# Altium footprint library XU-GENARAL PCB .PcbLib: 1176 footprints (part 16 of 75)
Each footprint in its own frame and in the unit in brackets; x right, y up, seen from the top. Pads: shape width x height; smd on the part's side, far side on the other; paste and mask are expansions set on the pad; w line width, h text height; cw(c..) or ccw(c..) is an arc to the next point about the centre after c.
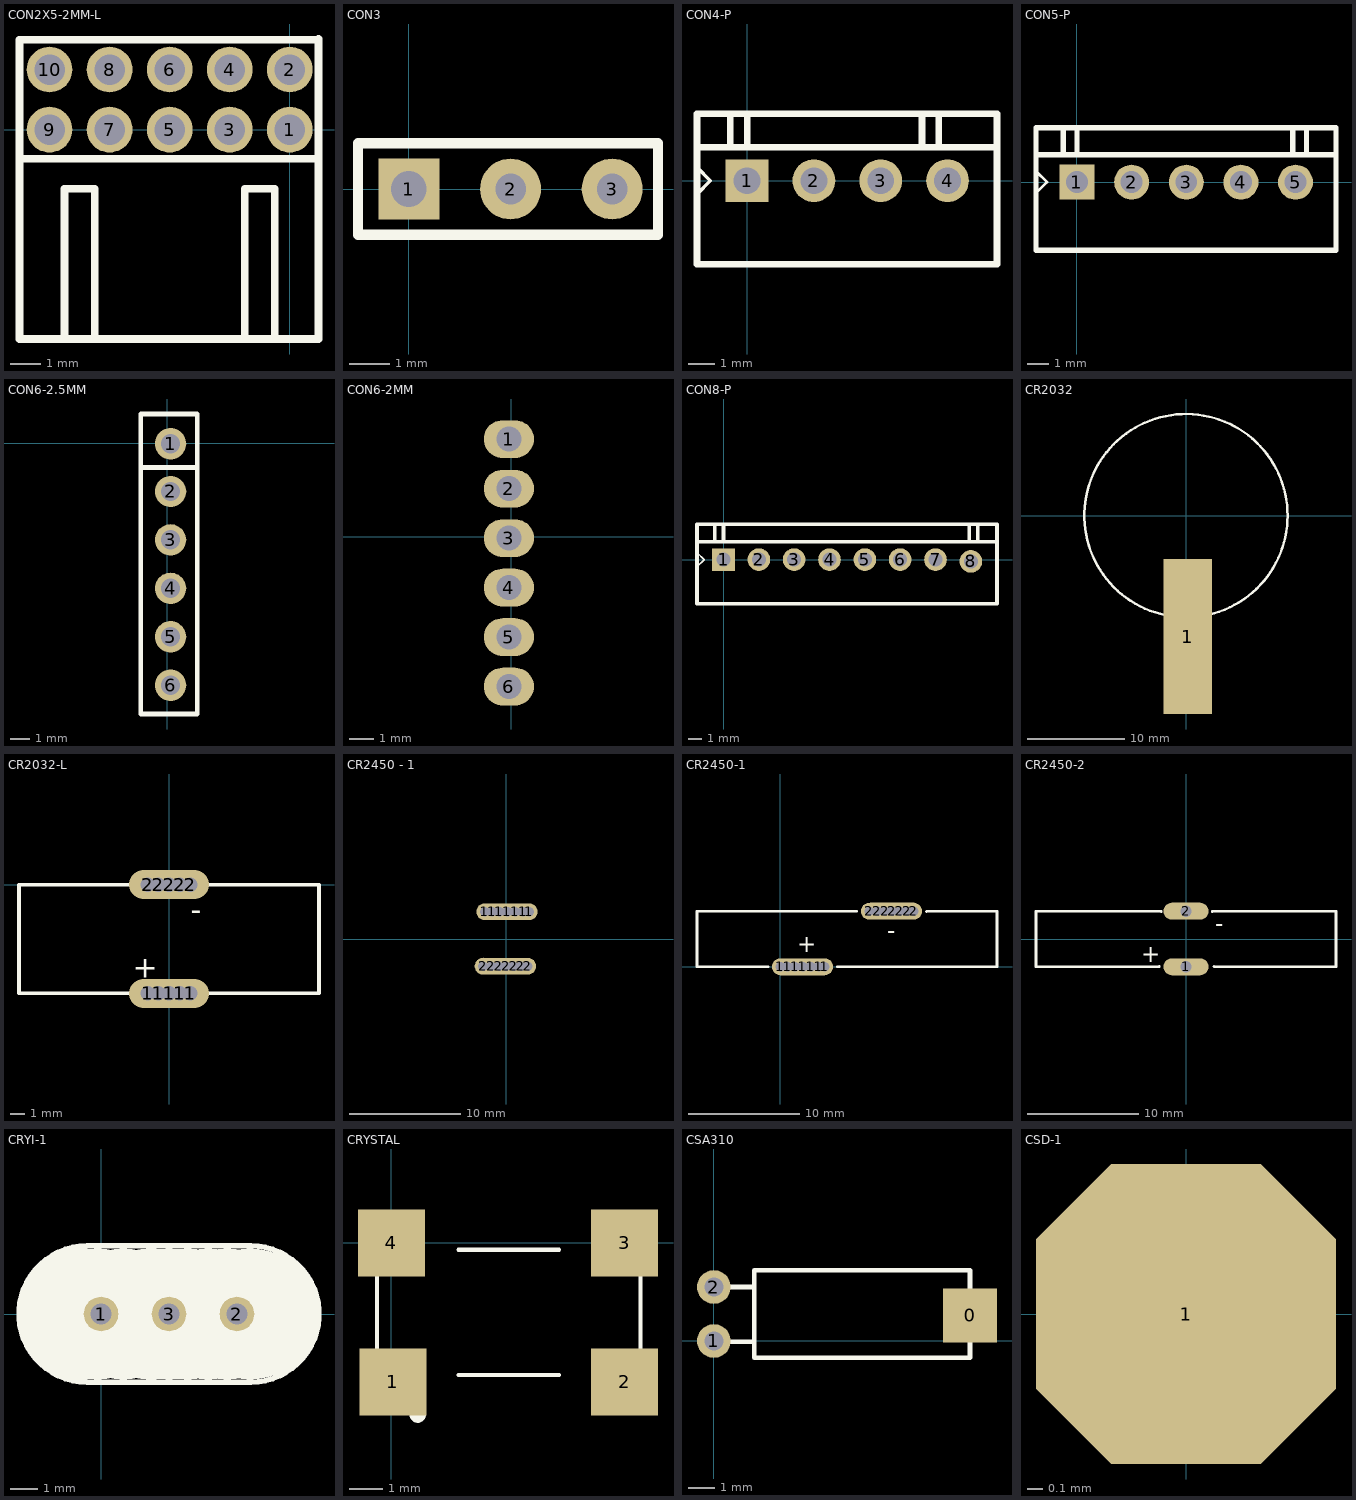
[diagram p15: the footprints below, top view; thin cyan lines are the x and y axes]

## CON2X5-2MM-L [mil]
pads (10):
  round 60 hole 40: 1(0,0) 2(0,78.74) 3(-78.74,0) 4(-78.74,78.74) 5(-157.48,0) 6(-157.48,78.74) 7(-236.22,0) 8(-236.22,78.74) 9(-314.96,0) 10(-314.96,78.74)
Top Overlay:
  lines w10: -295.28,-274.48 -295.28,-77.63 -275.59,-77.63 -255.91,-77.63 -255.91,-274.48 ; -59.06,-274.48 -59.06,-77.63 -19.68,-77.63 -19.68,-274.48 ; 30.6,-38.26 -354.33,-38.26 ; 33.6,117.74 -354.33,117.74 -354.33,-38.26 ; 37.6,118.74 37.6,-38.26 37.6,-274.48 -354.33,-274.48 -354.33,-38.26

## CON3 [mil]
height 43.31
pads (3):
  rect 60x60 hole 35: 1(0,0)
  round 60 hole 30: 2(100,0) 3(200,0)
Top Overlay:
  lines w10: -50,-45 245,-45 245,45 -50,45 -50,-45

## CON4-P [mil]
pads (4):
  rect 64x64 hole 40: 1(0,0)
  round 64 hole 40: 2(100,0) 3(200,0) 4(300,0)
Top Overlay:
  lines w5: -75,-20 -55,0 -75,20
  lines w10: -75,50 374.02,50 ; -25,50 -25,100 ; 0,50 0,100 ; 261.89,50 261.89,100 ; 286.89,50 286.89,100 ; -75,-125 374.02,-125 374.02,100 -75,100 -75,-125

## CON5-P [mil]
pads (5):
  rect 64x64 hole 40: 1(0,0)
  round 64 hole 40: 2(100,0) 3(200,0) 4(300,0) 5(400,0)
Top Overlay:
  lines w5: -75,-20 -55,0 -75,20
  lines w10: -75,50 474.02,50 ; -25,50 -25,100 ; 0,50 0,100 ; 395,50 395,100 ; 420,50 420,100 ; -75,-125 -75,100 474.02,100 474.02,-125 -75,-125

## CON6-2.5MM [mil]
pads (6):
  round 65 hole 40 mask+4: 1(6.5,-1.4) 2(6.5,-100) 3(6.5,-200) 4(6.5,-300) 5(6.5,-400) 6(6.5,-500)
Top Overlay:
  lines w10: -55.1,-50.6 61.8,-50.6 ; -50.5,60 61.8,60 61.8,-559.4 -55.1,-559.4 -55.1,60 -31.8,60

## CON6-2MM [mil]
height 21.65
pads (6):
  oval 80x60 hole 40: 1(-3.83,155.5) 2(-3.83,76.76) 3(-3.83,-1.98) 4(-3.83,-80.72) 5(-3.83,-159.46) 6(-3.83,-238.2)
Bottom Overlay:
  lines w8: -57.33,115.67 47.33,115.67 ; -60.67,-281.83 -60.67,195 49.33,195 50.16,194.17 50.16,-281.83 -60.67,-281.83

## CON8-P [mil]
pads (8):
  rect 64x64 hole 40: 1(0,0)
  round 64 hole 40: 2(100,0) 3(200,0) 4(300,0) 5(400,0) 6(500,0) 7(600,0) 8(700,-5)
Top Overlay:
  lines w5: -75,-20 -55,0 -75,20
  lines w10: -75,50 774.02,50 ; -25,50 -25,100 ; 0,50 0,100 ; 695,50 695,100 ; 720,50 720,100 ; -75,-125 774.02,-125 774.02,100 -75,100 -75,-125

## CR2032 [mm]
pads (1):
  rect 5x16 smd: 1(0.175,-12.5)
Top Overlay:
  circle w0.254: c0,0 r10.5

## CR2032-L [mil]
pads (10):
  round 80 hole 40: 1(-59.05,-300) 1(-29.53,-300) 1(29.53,-300) 1(59.05,-300) 2(-59.05,0) 2(-29.53,0) 2(29.53,0) 2(59.05,0)
  oval 220x80 hole 40: 1(0,-300) 2(0,0)
Top Overlay:
  lines w10: -59.05,-300 -413.39,-300 -413.39,0 -59.05,0 ; 59.05,-300 413.39,-300 413.39,0 59.05,0
  text "-" at 60,-99 h60
  text "+" at -100,-257 h60

## CR2450 - 1 [mil]
pads (14):
  round 60 hole 35: 1(-75.48,96.5) 1(-49.48,96.5) 1(-23.48,96.5) 1(32.52,96.5) 1(60.52,96.5) 1(81.52,96.5) 2(-81.52,-96.35) 2(-52.48,-96.5) 2(-25.48,-96.5) 2(26.52,-96.5) 2(52.52,-96.5) 2(76.52,-96.5)
  rect 157.48x60 hole 35: 1(4.52,96.5) 2(0.52,-96.5)
Bottom Overlay:
  lines w10: -131.33,-100.35 -524.76,-100.35 -524.76,96.5 -272.48,96.5 -125.48,96.5 ; 117.67,-100.35 166.67,-100.35 166.52,-100.5 538.09,-100.5 ; 138.52,96.5 538.24,96.5 538.24,-100.35
  text "-" at 112.52,-119.5 h60
  text "+" at 139.52,156.5 h60

## CR2450-1 [mil]
pads (14):
  round 60 hole 35: 1(0,0) 1(26,0) 1(52,0) 1(108,0) 1(136,0) 1(157.48,0) 2(314.96,196.85) 2(344,197) 2(371,197) 2(423,197) 2(449,197) 2(472.44,196.85)
  rect 157.48x60 hole 35: 1(80,0) 2(396,197)
Top Overlay:
  lines w10: -295.28,196.85 -295.28,0 -43,0 ; -295.28,197 270,197 ; 203,0 767.72,0 767.72,196.85 518,196
  text "+" at 60,52 h60
  text "-" at 379,99 h60

## CR2450-2 [mil]
pads (2):
  oval 160x60 hole 40: 1(0,-98.5) 2(0,98.5)
Top Overlay:
  lines w10: -531.5,98.35 -531.5,-98.5 -95,-98 ; -531.5,98.5 -88,98 ; 93,98 531.5,98.35 531.5,-98.5 99,-98
  text "+" at -159,-82 h60
  text "-" at 104,25 h60

## CRYI-1 [mil]
pads (3):
  round 50 hole 30: 1(0,0) 2(196.06,0) 3(98.03,0)
Top Overlay:
  circle w78.74: c100,0 r55
  circle w78.74: c126.97,0 r55
  circle w78.74: c156.97,0 r55
  circle w78.74: c183.94,0 r55
  circle w78.74: c216.97,0 r55
  circle w78.74: c71.97,0 r55
  circle w78.74: c-23.03,0 r55
  circle w78.74: c-3.03,0 r55
  circle w78.74: c33.94,0 r55
  circle w78.74: c76.97,0 r55
  lines w7.87: -20,-98.42 cw(c-20,0) -20,98.42 216.06,98.42 cw(c216.06,0) 216.06,-98.42 -20,-98.42

## CRYSTAL [mil]
height 68.9
pads (4):
  rect 80x80 smd: 1(1.73,-165.98) 2(278.27,-165.98) 3(278.27,0) 4(0,0)
Top Overlay:
  circle w9.84: c31.34,-205.04 r4.92
  lines w5: -17.48,-157.79 -17.48,-8.19 ; 80,-157.79 200,-157.79 ; 80,-8.19 200,-8.19 ; 297.48,-157.79 297.48,-8.19

## CSA310 [mil]
pads (3):
  rect 80x80 smd: 0(380,38)
  round 50 hole 28: 1(0,0) 2(0,80)
Top Overlay:
  lines w7: 0,-1 60,-1 ; 0,80 60,80 ; 60,-25 380,-25 380,105 60,105 60,-25

## CSD-1 [mm]
pads (1):
  oct 2x2 smd: 1(0,0)